# Altium footprint library Module.PcbLib: 64 footprints (part 2 of 4)
Each footprint in its own frame and in the unit in brackets; x right, y up, seen from the top. Pads: shape width x height; smd on the part's side, far side on the other; paste and mask are expansions set on the pad; w line width, h text height; cw(c..) or ccw(c..) is an arc to the next point about the centre after c.
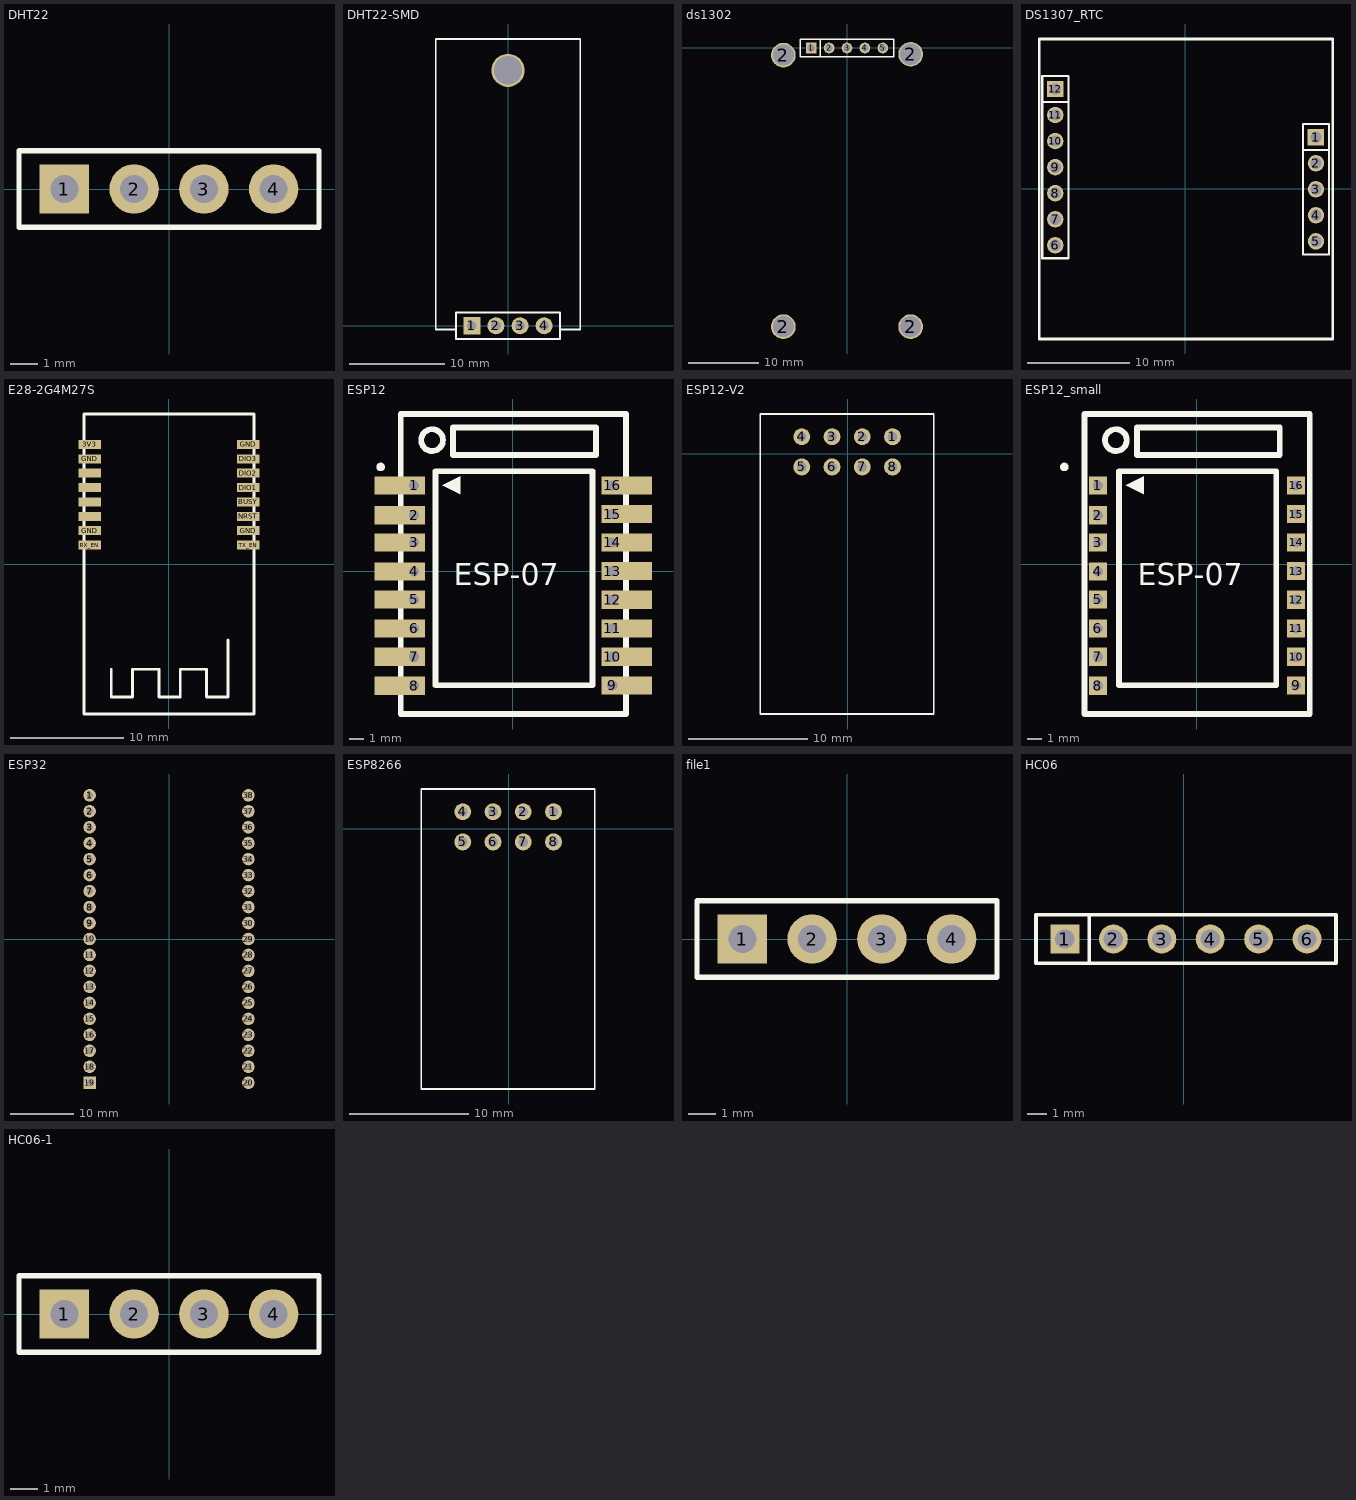
[diagram p1: the footprints below, top view; thin cyan lines are the x and y axes]

## DHT22 [mm]
height 8.5
pads (4):
  rect 1.8x1.8 hole 1.02: 1(-3.81,0)
  round 1.8 hole 1.02: 2(-1.27,0) 3(1.27,0) 4(3.81,0)
Top Overlay:
  lines w0.2: -5.461,-1.397 5.461,-1.397 5.461,1.397 -5.461,1.397 -5.461,-1.397
3D body "61300411821.stp": height 8.51, standoff -3.09, extent -5.33,-1.25 5.33,1.25
3D body "DHT22.SLDPRT": height 35.57, standoff 2.62, extent -7.862,-5.842 7.608,2.308

## DHT22-SMD [mm]
height 8.5
pads (5):
  rect 1.8x1.8 hole 1.02: 1(-3.81,0)
  round 1.8 hole 1.02: 2(-1.27,0) 3(1.27,0) 4(3.81,0)
  round 3.5 hole 3: ""(0,26.924)
Top Overlay:
  lines w0.2: -5.461,-0.381 -7.62,-0.381 -7.62,30.226 7.62,30.226 7.62,-0.381 5.461,-0.381 ; -5.461,-1.397 -5.461,1.397 5.461,1.397 5.461,-1.397 -5.461,-1.397
3D body "DHT22.stp": height 1.5, standoff -8.23, extent -7.55,-0.254 7.55,30.095

## ds1302 [mm]
height 8.5
pads (9):
  rect 1.52x1.52 hole 1.02: 1(-5.08,0)
  round 3.5 hole 3: 2(-9.017,-39.497) 2(-9.017,-1.016) 2(9.017,-39.497) 2(9.017,-0.889)
  round 1.52 hole 1.02: 2(-2.54,0) 3(0,0) 4(2.54,0) 5(5.08,0)
Top Overlay:
  lines w0.2: -3.81,-1.27 -3.81,1.27 ; -6.6,-1.27 6.6,-1.27 6.6,1.27 -6.6,1.27 -6.6,-1.27
3D body "61300511821.stp": height 8.51, standoff -3.09, extent -6.6,-1.25 6.6,1.25
3D body "REAL_TIME_SHEELD.stp": height 14, standoff 3.3, extent -11.5,-41.976 11.5,1.524

## DS1307_RTC [mm]
pads (12):
  rect 1.6x1.6 hole 1.1: 1(12.725,5.055) 12(-12.7,9.754)
  round 1.6 hole 1.1: 2(12.725,2.515) 3(12.725,-0.025) 4(12.725,-2.565) 5(12.725,-5.105) 6(-12.7,-5.486) 7(-12.7,-2.946) 8(-12.7,-0.406) 9(-12.7,2.134) 10(-12.7,4.674) 11(-12.7,7.214)
Top Overlay:
  lines w0.2: -13.97,8.484 -11.43,8.484 ; 11.455,3.785 13.995,3.785 ; -13.97,-6.756 -11.43,-6.756 -11.43,11.024 -13.97,11.024 -13.97,-6.756 ; 11.455,-6.375 11.455,6.325 13.995,6.325 13.995,-6.375 11.455,-6.375
  lines w0.254: -14.249,-14.63 14.351,-14.63 14.351,14.63 -14.249,14.63 -14.249,-14.63
3D body "HW-111_RTCmodule_DS1307.STEP": height 11.6, standoff 1.41, extent -13.75,-14.25 13.75,14.25
3D body "61300711121.stp": height 7.54, standoff -4, extent -13.97,-6.756 -11.43,11.024
3D body "61300511121.stp": height 7.54, standoff -4, extent 11.455,-6.375 13.995,6.325

## E28-2G4M27S [mm]
pads (16):
  rect 2x0.8 smd: 3V3(-7,10.56) BUSY(7,5.48) DIO1(7,6.75) DIO2(7,8.02) DIO3(7,9.29) GND(-7,2.94) GND(-7,9.29) GND(7,2.94) GND(7,10.56) MISO_TX(-7,8.02) MOSI_RX(-7,6.75) NRST(7,4.21) NSS_CTS(-7,4.21) RX_EN(-7,1.67) SCK_RTSN(-7,5.48) TX_EN(7,1.67)
Top Overlay:
  lines w0.254: -5.105,-9.296 -5.105,-11.734 -3.226,-11.734 -3.226,-9.296 -0.889,-9.296 -0.889,-11.734 0.991,-11.734 0.991,-9.296 3.327,-9.296 3.327,-11.735 5.207,-11.735 5.207,-6.706 ; -7.5,-13.25 7.5,-13.25 7.5,13.25 -7.5,13.25 -7.5,-13.25
3D body "734120110.stp": height 2.5, standoff 1.2, extent 3.413,-6.097 6.493,-3.097
3D body "E28.SLDPRT": height 2.8, standoff 0, extent -7.5,-13.25 7.5,13.25

## ESP12 [mm]
pads (16):
  rect 3.54x1.27 hole 0.71 copper offset -1,0: 1(-6.91,6.007) 2(-6.91,3.924) 3(-6.91,2.019) 4(-6.91,-0.013) 5(-6.91,-1.968) 6(-6.91,-4) 7(-6.91,-5.982) 8(-6.91,-8.014)
  rect 3.54x1.27 hole 0.71 copper offset 1,0: 9(6.963,-7.988) 10(6.963,-5.982) 11(6.963,-4) 12(6.963,-1.994) 13(6.963,0.013) 14(6.963,2.019) 15(6.963,4) 16(6.963,6.007)
Top Overlay:
  circle w0.3: c-9.257,7.304 r0.15
  circle w0.406: c-5.651,9.182 r0.762
  region: -4.953,6.02 -3.683,5.385 -3.683,6.655
  lines w0.406: -7.849,-9.995 -7.849,11.011 7.925,11.011 7.925,-9.995 -7.849,-9.995 ; -5.423,-7.988 5.575,-7.988 5.575,6.998 -5.423,6.998 -5.423,-7.988 ; -4.178,8.141 5.829,8.141 5.829,10.071 -4.178,10.071 -4.178,8.141
  text "ESP-07" at -4.127,-0.978 h1.52
Mechanical 2:
Mechanical 4:
  text ">VALUE" at 8.572,6.007 h0.04
  text ">VALUE" at 8.572,4 h0.04
  text ">VALUE" at 8.572,2.019 h0.04
  text ">VALUE" at 8.572,0.013 h0.04
  text ">VALUE" at 8.572,-1.994 h0.04
  text ">VALUE" at 8.572,-4 h0.04
  text ">VALUE" at 8.572,-5.982 h0.04
  text ">VALUE" at 8.572,-7.988 h0.04
  text ">VALUE" at -8.42,-5.982 h0.04
  text ">VALUE" at -8.42,-4 h0.04
  text ">VALUE" at -8.42,-1.994 h0.04
  text ">VALUE" at -8.42,0.013 h0.04
  text ">VALUE" at -8.42,2.019 h0.04
  text ">VALUE" at -8.42,4 h0.04
  text ">VALUE" at -8.42,6.007 h0.04
  text ">VALUE" at -8.369,5.982 h0.04
  text ">VALUE" at -8.369,3.95 h0.04
  text ">VALUE" at -8.395,-5.982 h0.04
3D body "62000811821.stp": height 4.31, standoff -2.39, extent 5.728,-9.271 8.128,7.229
3D body "62000811821.stp": height 4.31, standoff -2.39, extent -8.115,-9.139 -5.715,7.361
3D body "62000811121.stp": height 9, standoff 0.2, extent 5.985,-9.016 7.985,6.984
3D body "62000811121.stp": height 9, standoff 0.2, extent -7.985,-8.889 -5.985,7.111
3D body "AI-THINKER_ESP-12.STEP": height 9, standoff 6.2, extent -7.874,-9.46 8.126,14.54

## ESP12-V2 [mil]
pads (8):
  round 56 hole 32: 1(148,57) 2(48,57) 3(-52,57) 4(-152,57) 5(-152,-43) 6(-52,-43) 7(48,-43) 8(148,-43)
Top Overlay:
  lines w5: -290,-860 -290,132 285,132 285,-860 -290,-860
3D body "Base PCB.stp": height 210.04, standoff -32.87, extent -202,-1693.2 698,326

## ESP12_small [mm]
pads (16):
  rect 1.27x1.27 hole 0.71: 1(-6.91,5.499) 2(-6.91,3.416) 3(-6.91,1.511) 4(-6.91,-0.521) 5(-6.91,-2.476) 6(-6.91,-4.508) 7(-6.91,-6.49) 8(-6.91,-8.522) 9(6.963,-8.496) 10(6.963,-6.49) 11(6.963,-4.508) 12(6.963,-2.502) 13(6.963,-0.495) 14(6.963,1.511) 15(6.963,3.492) 16(6.963,5.499)
Top Overlay:
  circle w0.406: c-5.651,8.674 r0.762
  circle w0.3: c-9.257,6.796 r0.15
  region: -4.953,5.512 -3.683,4.877 -3.683,6.147
  lines w0.406: -7.849,-10.503 7.925,-10.503 7.925,10.503 -7.849,10.503 -7.849,-10.503 ; -5.423,-8.496 -5.423,6.49 5.575,6.49 5.575,-8.496 -5.423,-8.496 ; -4.178,7.633 -4.178,9.563 5.829,9.563 5.829,7.633 -4.178,7.633
  text "ESP-07" at -4.127,-1.486 h1.52
Mechanical 2:
Mechanical 4:
  text ">VALUE" at -8.395,-6.49 h0.04
  text ">VALUE" at -8.369,3.442 h0.04
  text ">VALUE" at -8.369,5.474 h0.04
  text ">VALUE" at -8.42,5.499 h0.04
  text ">VALUE" at -8.42,3.492 h0.04
  text ">VALUE" at -8.42,1.511 h0.04
  text ">VALUE" at -8.42,-0.495 h0.04
  text ">VALUE" at -8.42,-2.502 h0.04
  text ">VALUE" at -8.42,-4.508 h0.04
  text ">VALUE" at -8.42,-6.49 h0.04
  text ">VALUE" at 8.572,-8.496 h0.04
  text ">VALUE" at 8.572,-6.49 h0.04
  text ">VALUE" at 8.572,-4.508 h0.04
  text ">VALUE" at 8.572,-2.502 h0.04
  text ">VALUE" at 8.572,-0.495 h0.04
  text ">VALUE" at 8.572,1.511 h0.04
  text ">VALUE" at 8.572,3.492 h0.04
  text ">VALUE" at 8.572,5.499 h0.04
3D body "AI-THINKER_ESP-12.STEP": height 9, standoff 6.2, extent -7.874,-9.968 8.126,14.032
3D body "62000811121.stp": height 9, standoff 0.2, extent -7.985,-9.397 -5.985,6.603
3D body "62000811121.stp": height 9, standoff 0.2, extent 5.985,-9.524 7.985,6.476
3D body "62000811821.stp": height 4.31, standoff -2.39, extent -8.115,-9.647 -5.715,6.853
3D body "62000811821.stp": height 4.31, standoff -2.39, extent 5.728,-9.779 8.128,6.721

## ESP32 [mm]
pads (38):
  round 2 hole 1.02: 1(-12.625,22.86) 2(-12.625,20.32) 3(-12.625,17.78) 4(-12.625,15.24) 5(-12.625,12.7) 6(-12.625,10.16) 7(-12.625,7.62) 8(-12.625,5.08) 9(-12.625,2.54) 10(-12.625,0) 11(-12.625,-2.54) 12(-12.625,-5.08) 13(-12.625,-7.62) 14(-12.625,-10.16) 15(-12.625,-12.7) 16(-12.625,-15.24) 17(-12.625,-17.78) 18(-12.625,-20.32) 20(12.625,-22.86) 21(12.625,-20.32) 22(12.625,-17.78) 23(12.625,-15.24) 24(12.625,-12.7) 25(12.625,-10.16) 26(12.625,-7.62) 27(12.625,-5.08) 28(12.625,-2.54) 29(12.625,0) 30(12.625,2.54) 31(12.625,5.08) 32(12.625,7.62) 33(12.625,10.16) 34(12.625,12.7) 35(12.625,15.24) 36(12.625,17.78) 37(12.625,20.32) 38(12.625,22.86)
  rect 2x2 hole 1.02: 19(-12.625,-22.86)
3D body "User Library-Goouuu-ESP32 Development Board.step": height 9.6, standoff -3.54, extent -13.97,-28.13 13.97,27.45

## ESP8266 [mil]
pads (8):
  round 56 hole 32: 1(148,57) 2(48,57) 3(-52,57) 4(-152,57) 5(-152,-43) 6(-52,-43) 7(48,-43) 8(148,-43)
Top Overlay:
  lines w5: -290,-860 -290,132 285,132 285,-860 -290,-860
3D body "61300821821.stp": height 335.04, standoff -121.65, extent -209.84,-90 209.84,110
3D body "Wi07C.step": height 566.04, standoff 106.3, extent -290,-858.19 280.87,118.19

## file1 [mm]
height 8.5
pads (4):
  rect 1.8x1.8 hole 1.02: 1(-3.81,0)
  round 1.8 hole 1.02: 2(-1.27,0) 3(1.27,0) 4(3.81,0)
Top Overlay:
  lines w0.2: -5.461,-1.397 -5.461,1.397 5.461,1.397 5.461,-1.397 -5.461,-1.397
3D body "61300411821.stp": height 8.51, standoff -3.09, extent -5.33,-1.25 5.33,1.25
3D body "?????? ?????-????? 1.STEP": height 25.22, standoff -30.17, extent -21.674,3.275 18.626,11.025

## GSM ARDUINO [mm]
height 8.5
3D body "GSM Arduino Shield SIM900.SLDPRT": height 111.25, standoff -8, extent -45.935,-33.254 52.055,32.746

## HC06 [mm]
height 8.5
pads (6):
  rect 1.52x1.52 hole 1.02: 1(-6.223,0)
  round 1.52 hole 1.02: 2(-3.683,0) 3(-1.143,0) 4(1.397,0) 5(3.937,0) 6(6.477,0)
Top Overlay:
  lines w0.2: -4.953,-1.27 -4.953,1.27 ; -7.743,-1.27 -7.743,1.27 7.997,1.27 7.997,-1.27 -7.743,-1.27
3D body "HC-06.SLDPRT": height 46, standoff 19.1, extent -6.373,2.307 6.627,3.937
3D body "Bluetooth 4.0 BLE.STEP": height 45.6, standoff 1.22, extent -7.723,-0.323 7.977,6.477
3D body "61300611821.stp": height 8.51, standoff -3.09, extent -7.743,-1.25 7.997,1.25

## HC06-1 [mm]
height 8.5
pads (4):
  rect 1.8x1.8 hole 1.02: 1(-3.81,0)
  round 1.8 hole 1.02: 2(-1.27,0) 3(1.27,0) 4(3.81,0)
Top Overlay:
  lines w0.2: -5.461,-1.397 -5.461,1.397 5.461,1.397 5.461,-1.397 -5.461,-1.397
3D body "61300411821.stp": height 8.51, standoff -3.09, extent -5.33,-1.25 5.33,1.25
3D body "HC-06.SLDPRT": height 46, standoff 3.25, extent -7.627,-0.539 7.373,5.561

## HM11 [mm]
height 8.5
3D body "PZ_HM-11.stp": height 0.45, standoff -0.5, extent -8.996,-7.131 9.504,6.369

## IMU-QIUCK [mm]
height 8.5
3D body "IMU_Quick.SLDPRT": height 3, standoff 0, extent -7.992,-8.809 9.008,17.191